# Altium footprint library 3D封装库.PcbLib: 716 footprints (part 14 of 45)
Each footprint in its own frame and in the unit in brackets; x right, y up, seen from the top. Pads: shape width x height; smd on the part's side, far side on the other; paste and mask are expansions set on the pad; w line width, h text height; cw(c..) or ccw(c..) is an arc to the next point about the centre after c.
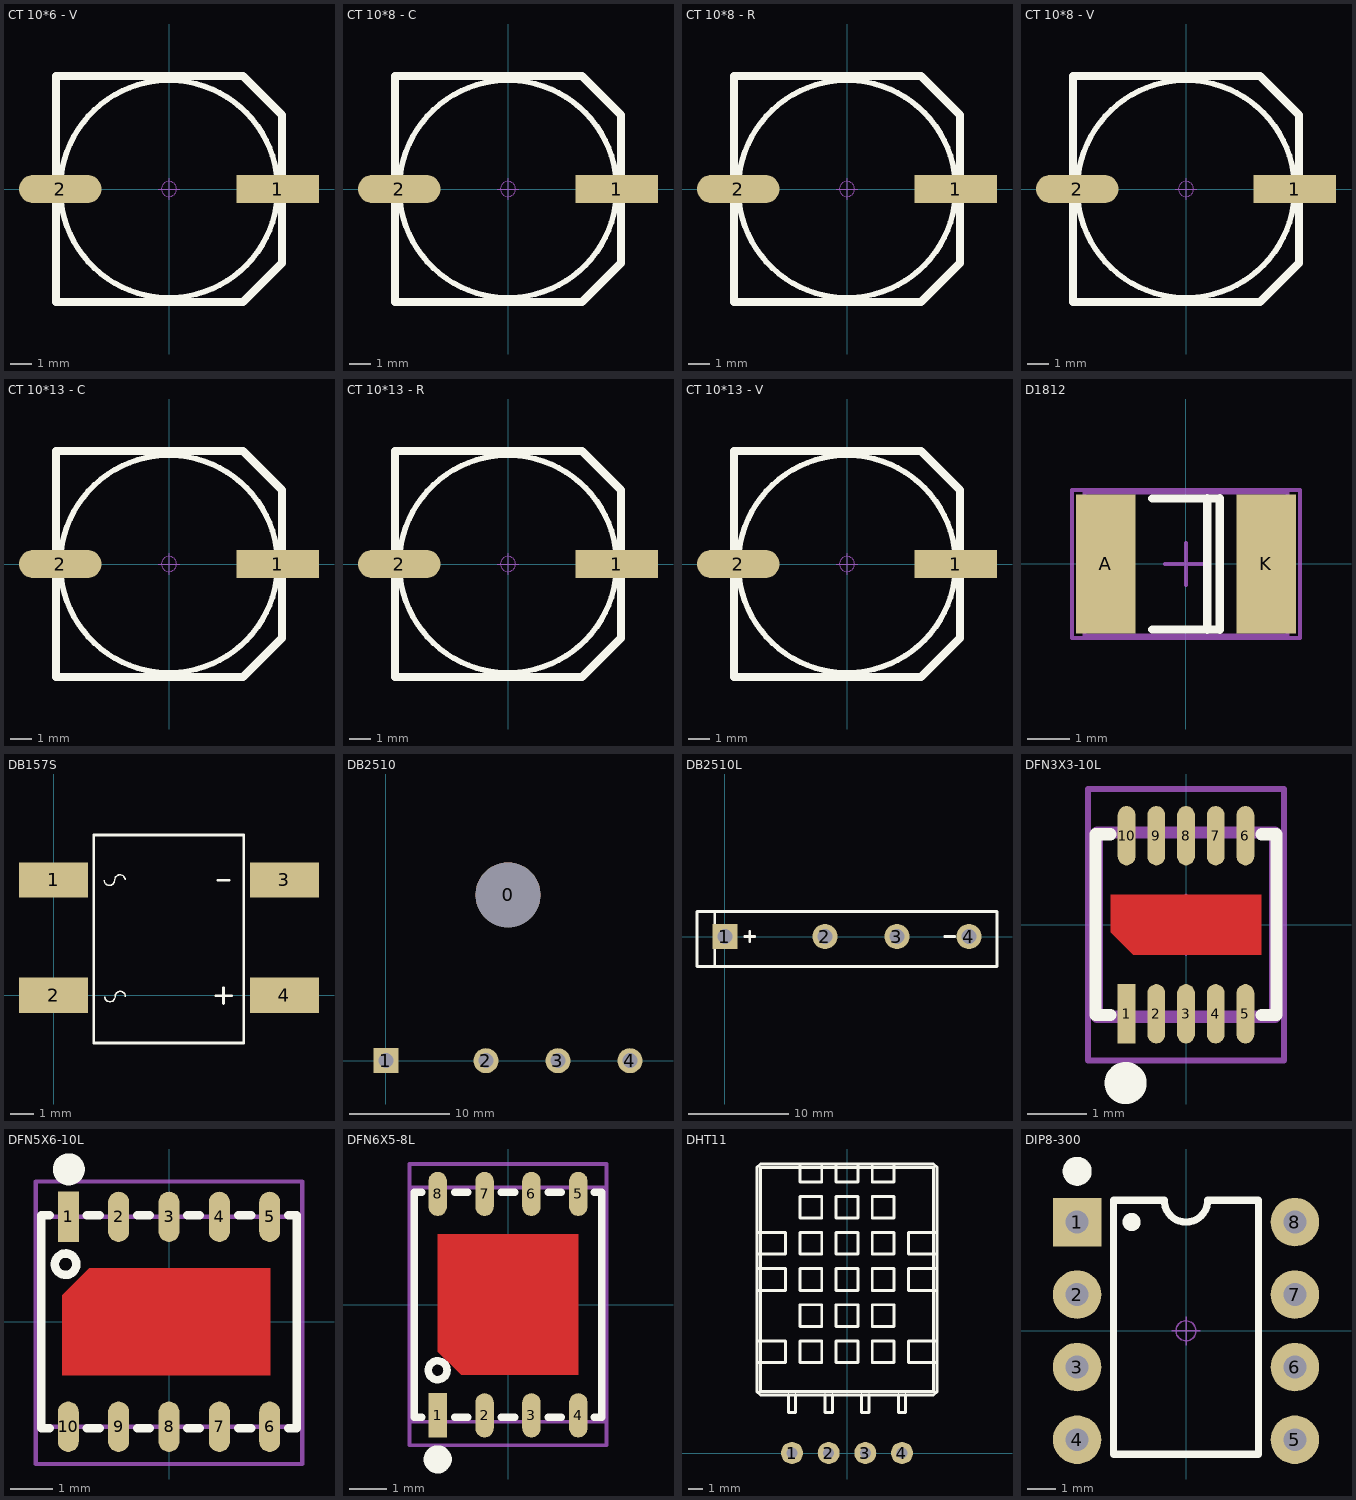
[diagram p13: the footprints below, top view; thin cyan lines are the x and y axes]

## CT 10*6 - V [mm] "直径10mm，高6mm"
pads (2):
  rect 3.8x1.3 smd: 1(5,0)
  oval 3.8x1.3 smd: 2(-5,0)
Top Overlay:
  circle w0.254: c0,0 r5
  lines w0.381: 5.191,-3.413 3.404,-5.2 -5.2,-5.2 -5.2,5.2 3.404,5.2 5.2,3.404 5.2,-3.404
Mechanical 15:
  circle w0.05: c0,0 r0.35
  lines w0.05: -0.5,0 0.5,0 ; 0,-0.5 0,0.5
3D body "CT 10X6-V.STEP": height 6, standoff -0.01, extent -5.8,-5.15 5.8,5.15

## CT 10*8 - C [mm] "直径10mm，高8mm"
pads (2):
  rect 3.8x1.3 smd: 1(5,0)
  oval 3.8x1.3 smd: 2(-5,0)
Top Overlay:
  circle w0.254: c0,0 r5
  lines w0.381: 5.191,-3.413 3.404,-5.2 -5.2,-5.2 -5.2,5.2 3.404,5.2 5.2,3.404 5.2,-3.404
Mechanical 15:
  circle w0.05: c0,0 r0.35
  lines w0.05: -0.5,0 0.5,0 ; 0,-0.5 0,0.5
3D body "CT 10X8-C.STEP": height 8, standoff -0.01, extent -5.8,-5.15 5.8,5.15

## CT 10*8 - R [mm] "直径10mm，高8mm"
pads (2):
  rect 3.8x1.3 smd: 1(5,0)
  oval 3.8x1.3 smd: 2(-5,0)
Top Overlay:
  circle w0.254: c0,0 r5
  lines w0.381: 5.191,-3.413 3.404,-5.2 -5.2,-5.2 -5.2,5.2 3.404,5.2 5.2,3.404 5.2,-3.404
Mechanical 15:
  circle w0.05: c0,0 r0.35
  lines w0.05: -0.5,0 0.5,0 ; 0,-0.5 0,0.5
3D body "CT 10X8-R.STEP": height 8, standoff -0.01, extent -5.8,-5.15 5.8,5.15

## CT 10*8 - V [mm] "直径10mm，高8mm"
pads (2):
  rect 3.8x1.3 smd: 1(5,0)
  oval 3.8x1.3 smd: 2(-5,0)
Top Overlay:
  circle w0.254: c0,0 r5
  lines w0.381: 5.191,-3.413 3.404,-5.2 -5.2,-5.2 -5.2,5.2 3.404,5.2 5.2,3.404 5.2,-3.404
Mechanical 15:
  circle w0.05: c0,0 r0.35
  lines w0.05: -0.5,0 0.5,0 ; 0,-0.5 0,0.5
3D body "CT 10X8-V.STEP": height 8, standoff -0.01, extent -5.8,-5.15 5.8,5.15

## CT 10*13 - C [mm] "直径10mm，高13mm"
pads (2):
  rect 3.8x1.3 smd: 1(5,0)
  oval 3.8x1.3 smd: 2(-5,0)
Top Overlay:
  circle w0.254: c0,0 r5
  lines w0.381: 5.191,-3.413 3.404,-5.2 -5.2,-5.2 -5.2,5.2 3.404,5.2 5.2,3.404 5.2,-3.404
Mechanical 15:
  circle w0.05: c0,0 r0.35
  lines w0.05: -0.5,0 0.5,0 ; 0,-0.5 0,0.5
3D body "CT 10X13-C.STEP": height 13, standoff -0.01, extent -5.8,-5.15 5.8,5.15

## CT 10*13 - R [mm] "直径10mm，高13mm"
pads (2):
  rect 3.8x1.3 smd: 1(5,0)
  oval 3.8x1.3 smd: 2(-5,0)
Top Overlay:
  circle w0.254: c0,0 r5
  lines w0.381: 5.191,-3.413 3.404,-5.2 -5.2,-5.2 -5.2,5.2 3.404,5.2 5.2,3.404 5.2,-3.404
Mechanical 15:
  circle w0.05: c0,0 r0.35
  lines w0.05: -0.5,0 0.5,0 ; 0,-0.5 0,0.5
3D body "CT 10X13-R.STEP": height 13, standoff -0.01, extent -5.8,-5.15 5.8,5.15

## CT 10*13 - V [mm] "直径10mm，高13mm"
pads (2):
  rect 3.8x1.3 smd: 1(5,0)
  oval 3.8x1.3 smd: 2(-5,0)
Top Overlay:
  circle w0.254: c0,0 r5
  lines w0.381: 5.191,-3.413 3.404,-5.2 -5.2,-5.2 -5.2,5.2 3.404,5.2 5.2,3.404 5.2,-3.404
Mechanical 15:
  circle w0.05: c0,0 r0.35
  lines w0.05: -0.5,0 0.5,0 ; 0,-0.5 0,0.5
3D body "CT 10X13-V.STEP": height 13, standoff -0.01, extent -5.8,-5.15 5.8,5.15

## D1812 [mm] "Chip Capacitor, Body 4.5x3.2mm, IPC High Density"
height 1.4
pads (2):
  rect 1.4x3.3 smd: A(-1.9,0) K(1.9,0)
Top Overlay:
  lines w0.2: -0.8,-1.55 0.8,-1.55 ; -0.8,1.55 0.8,1.55
  lines w0.203: 0.5,-1.55 0.5,1.55 ; 0.8,-1.55 0.8,1.55
Mechanical 13:
  lines w0.1: -2.4,-1.7 -2.4,1.7 2.4,1.7 2.4,-1.7 -2.4,-1.7
Mechanical 15:
  lines w0.1: -0.5,0 0.5,0 ; 0,-0.5 0,0.5 ; -2.7,-1.75 -2.7,1.75 2.7,1.75 2.7,-1.75 -2.7,-1.75
3D body: height 1.4, standoff 0, extent -2.4,-1.7 2.4,1.7

## DB157S [mm]
pads (4):
  rect 3x1.524 smd: 1(0,5) 2(0,0) 3(10,5) 4(10,0)
Top Overlay:
  lines w0.06: 2.192,4.982 ccw(c2.416,4.985) 2.641,4.985 ; 2.215,-0.058 ccw(c2.44,-0.055) 2.664,-0.055 cw(c2.889,-0.055) 3.113,-0.051 ; 2.649,4.999 cw(c2.873,4.999) 3.098,5.002
  lines w0.12: 1.74,-2.063 8.24,-2.063 8.24,6.937 ; 1.74,-2.056 1.74,6.944 8.24,6.944 ; 7.023,-0.015 7.711,-0.015 ; 7.129,4.985 7.605,4.985 ; 7.367,-0.359 7.367,0.329
3D body "DB-S.STEP": height 3.35, standoff 0, extent 0.025,-2.134 9.96,7.016

## DB2510 [mm]
pads (5):
  round 6.5 hole 6.5: 0(12.206,16.588)
  rect 2.5x2.5 hole 1.5: 1(0,0)
  round 2.5 hole 1.5: 2(10,0) 3(17.2,0) 4(24.4,0)
Bottom Overlay:
  lines w0.203: -2.794,10.16 27.206,10.16 ; -0.5,1.5 -0.5,5.5 ; 0.5,1.5 0.5,5.5 ; 9.541,1.5 9.541,5.5 ; 10.541,1.5 10.541,5.5 ; 16.653,1.5 16.653,5.5 ; 17.653,1.5 17.653,5.5 ; 23.892,1.5 23.892,5.5 ; 24.892,1.5 24.892,5.5 ; -2.794,5.588 -2.794,22.588 0.206,25.588 27.206,25.588 27.206,5.588 -2.794,5.588
  lines w0.254: -0.54,6.858 0.46,6.858 ; -0.04,6.358 -0.04,7.358 ; 8.96,6.858 ccw(c9.46,6.858) 9.96,6.858 cw(c10.46,6.858) 10.96,6.858 ; 15.952,6.858 ccw(c16.452,6.858) 16.952,6.858 cw(c17.452,6.858) 17.952,6.858 ; 24.138,6.858 24.638,6.858

## DB2510L [mm]
pads (4):
  rect 2.5x2.5 hole 1.5: 1(0,0)
  round 2.5 hole 1.5: 2(10,0) 3(17.2,0) 4(24.4,0)
Top Overlay:
  lines w0.254: -1,-3 -1,2.5 ; 2,0 3,0 ; 2.5,-0.5 2.5,0.5 ; 22,0 23,0 ; -2.794,-3 27.206,-3 27.206,2.5 -2.794,2.5 -2.794,-3

## DFN3X3-10L [mm] "3mm*3mm*0.5mm(长*宽*脚距）"
pads (10):
  rect 0.3x1 smd: 1(-1,-1.5)
  oval 0.3x1 smd: 2(-0.5,-1.5) 3(0,-1.5) 4(0.5,-1.5) 5(1,-1.5) 6(1,1.5) 7(0.5,1.5) 8(0,1.5) 9(-0.5,1.5) 10(-1,1.5)
Top Layer:
  region: -1.27,0.508 1.27,0.508 1.27,-0.508 -0.889,-0.508 -1.27,-0.127
Top Overlay:
  circle w0.508: c-1.016,-2.667 r0.1
  lines w0.203: -1.27,-1.524 -1.524,-1.524 -1.524,1.524 -1.27,1.524 ; 1.27,-1.524 1.524,-1.524 1.524,1.524 1.27,1.524
Top Solder:
  region: -1.27,0.508 1.27,0.508 1.27,-0.508 -0.889,-0.508 -1.27,-0.127
Mechanical 13:
  lines w0.203: 1.5,-1.55 1.5,1.55 ; -1.5,-1.55 -1.5,1.55 1.5,1.55 1.5,-1.55 -1.5,-1.55
Mechanical 15:
  circle w0.05: c0,0 r0.35
  lines w0.05: -0.5,0 0.5,0 ; 0,-0.5 0,0.5
  lines w0.1: -1.651,-2.286 -1.651,2.286 1.651,2.286 1.651,-2.286 -1.651,-2.286
3D body "VDFN3X3-10L.STEP": height 1.06, standoff 0.02, extent -1.5,-1.55 1.5,1.55

## DFN5X6-10L [mm] "5mm*6mm*1.2mm(长*宽*脚距）"
pads (10):
  rect 0.5x1.2 smd: 1(-2.4,2.5)
  oval 0.5x1.2 smd: 2(-1.2,2.5) 3(0,2.5) 4(1.2,2.5) 5(2.4,2.5) 6(2.4,-2.5) 7(1.2,-2.5) 8(0,-2.5) 9(-1.2,-2.5) 10(-2.4,-2.5)
Top Layer:
  region: 2.413,1.27 -1.905,1.27 -2.54,0.635 -2.54,-1.27 2.413,-1.27
Top Overlay:
  circle w0.203: c-2.464,1.372 r0.255
  circle w0.508: c-2.388,3.632 r0.127
  lines w0.203: -2.845,-2.54 -3.048,-2.54 -3.048,2.54 -2.845,2.54 ; -1.956,-2.54 -1.651,-2.54 ; -1.956,2.54 -1.651,2.54 ; -0.762,-2.54 -0.457,-2.54 ; -0.762,2.54 -0.457,2.54 ; 0.432,-2.54 0.737,-2.54 ; 0.432,2.54 0.737,2.54 ; 1.651,-2.54 1.956,-2.54 ; 1.651,2.54 1.956,2.54 ; 2.845,-2.54 3.048,-2.54 3.048,2.54 2.845,2.54
Top Solder:
  region: 2.413,1.27 -1.905,1.27 -2.54,0.635 -2.54,-1.27 2.413,-1.27
Mechanical 13:
  lines w0.1: -3,-2.5 3,-2.5 3,2.5 -3,2.5 -3,-2.5
Mechanical 15:
  circle w0.05: c0,0 r0.35
  lines w0.05: -0.5,0 0.5,0 ; 0,-0.5 0,0.5
  lines w0.1: -3.175,-3.389 3.175,-3.389 3.175,3.342 -3.175,3.342 -3.175,-3.389
3D body "VDFN5X6-10L.STEP": height 1.06, standoff 0.02, extent -3,-2.55 3,2.55

## DFN6X5-8L [mm] "6mm*5mm*1.27mm(长*宽*脚距)"
pads (8):
  rect 0.5x1.2 smd: 1(-1.905,-3)
  oval 0.5x1.2 smd: 2(-0.635,-3) 3(0.635,-3) 4(1.905,-3) 5(1.905,3) 6(0.635,3) 7(-0.635,3) 8(-1.905,3)
Top Layer:
  region: 1.905,-1.905 -1.27,-1.905 -1.905,-1.27 -1.905,1.905 1.905,1.905
Top Overlay:
  circle w0.203: c-1.905,-1.778 r0.255
  circle w0.508: c-1.905,-4.191 r0.127
  lines w0.203: -2.337,-3.048 -2.54,-3.048 -2.54,3.048 -2.337,3.048 ; -1.448,-3.048 -1.092,-3.048 ; -1.448,3.048 -1.092,3.048 ; -0.178,-3.048 0.178,-3.048 ; -0.178,3.048 0.178,3.048 ; 1.092,-3.048 1.448,-3.048 ; 1.092,3.048 1.448,3.048 ; 2.337,-3.048 2.54,-3.048 2.54,3.048 2.337,3.048
Top Solder:
  region: 1.905,-1.905 -1.27,-1.905 -1.905,-1.27 -1.905,1.905 1.905,1.905
Mechanical 13:
  lines w0.1: -2.667,-3.175 2.667,-3.175 2.667,1.905 2.667,3.175 -2.667,3.175 -2.667,-3.175
Mechanical 15:
  circle w0.05: c0,0 r0.35
  lines w0.05: -0.5,0 0.5,0 ; 0,-0.5 0,0.5
  lines w0.1: -2.667,-3.81 2.667,-3.81 2.667,3.81 -2.667,3.81 -2.667,-3.81
3D body "VDFN6X5-8L.STEP": height 1.06, standoff 0.03, extent -2.5,-3.05 2.5,3.05

## DHT11 [mil] "温湿度传感器"
pads (4):
  round 60 hole 30: 1(-150,0) 2(-50,0) 3(50,0) 4(150,0)
Top Overlay:
  lines w8: -246.06,247.01 -167.32,247.01 -167.32,306.06 -246.06,306.06 ; -246.06,443.86 -167.32,443.86 -167.32,502.91 -246.06,502.91 ; -246.06,542.28 -167.32,542.28 -167.32,601.34 -246.06,601.34 ; -160,160 -160,110 -140,110 -140,160 ; -127.95,788.35 -127.95,739.13 -68.9,739.13 -68.9,788.35 ; -60,160 -60,110 -40,110 -40,160 ; -29.53,788.35 -29.53,739.13 29.53,739.13 29.53,788.35 ; 40,160 40,110 60,110 60,160 ; 68.9,788.35 68.9,739.13 127.95,739.13 127.95,788.35 ; 140,160 140,110 160,110 160,160 ; 246.06,247.01 167.32,247.01 167.32,306.06 246.06,306.06 ; 246.06,443.86 167.32,443.86 167.32,502.91 246.06,502.91 ; 246.06,542.28 167.32,542.28 167.32,601.34 246.06,601.34 ; -246.06,168.27 -246.06,778.5 -236.22,788.35 236.22,788.35 246.06,778.5 246.06,168.27 236.22,158.43 -236.22,158.43 -246.06,168.27 ; -236.22,168.27 -236.22,778.5 236.22,778.5 236.22,168.27 -236.22,168.27 ; -127.95,247.01 -68.9,247.01 -68.9,306.06 -127.95,306.06 -127.95,247.01 ; -127.95,345.43 -68.9,345.43 -68.9,404.49 -127.95,404.49 -127.95,345.43 ; -127.95,443.86 -68.9,443.86 -68.9,502.91 -127.95,502.91 -127.95,443.86 ; -127.95,542.28 -68.9,542.28 -68.9,601.34 -127.95,601.34 -127.95,542.28 ; -127.95,640.71 -68.9,640.71 -68.9,699.76 -127.95,699.76 -127.95,640.71 ; -29.53,247.01 29.53,247.01 29.53,306.06 -29.53,306.06 -29.53,247.01 ; -29.53,345.43 29.53,345.43 29.53,404.49 -29.53,404.49 -29.53,345.43 ; -29.53,443.86 29.53,443.86 29.53,502.91 -29.53,502.91 -29.53,443.86 ; -29.53,542.28 29.53,542.28 29.53,601.34 -29.53,601.34 -29.53,542.28 ; -29.53,640.71 29.53,640.71 29.53,699.76 -29.53,699.76 -29.53,640.71 ; 68.9,247.01 127.95,247.01 127.95,306.06 68.9,306.06 68.9,247.01 ; 68.9,345.43 127.95,345.43 127.95,404.49 68.9,404.49 68.9,345.43 ; 68.9,443.86 127.95,443.86 127.95,502.91 68.9,502.91 68.9,443.86 ; 68.9,542.28 127.95,542.28 127.95,601.34 68.9,601.34 68.9,542.28 ; 68.9,640.71 127.95,640.71 127.95,699.76 68.9,699.76 68.9,640.71
3D body "User Library-DHT11-3-1.STEP": height 225.59, standoff -54.72, extent -246.85,-5 246.85,788.31

## DIP8-300 [mm] "9.4*7.6*3.8(长宽高）"
pads (8):
  rect 1.7x1.7 hole 0.8: 1(-3.81,3.81)
  round 1.7 hole 0.8: 2(-3.81,1.27) 3(-3.81,-1.27) 4(-3.81,-3.81) 5(3.81,-3.81) 6(3.81,-1.27) 7(3.81,1.27) 8(3.81,3.81)
Top Overlay:
  circle w0.508: c-3.81,5.588 r0.254
  circle w0.381: c-1.905,3.81 r0.127
  lines w0.254: -2.54,-4.318 2.54,-4.318 2.54,4.572 0.762,4.572 cw(c0,4.572) 0,3.81 cw(c0,4.572) -0.762,4.572 -2.54,4.572 -2.54,-4.318
Mechanical 15:
  circle w0.05: c0,0 r0.35
  lines w0.05: -0.5,0 0.5,0 ; 0,-0.5 0,0.5
3D body "DIP8-300.STEP": height 4.5, standoff -3.2, extent -3.925,-4.7 3.925,4.7